# Altium footprint library con-samtec.PCBLIB: 805 footprints (part 20 of 55)
Each footprint in its own frame and in the unit in brackets; x right, y up, seen from the top. Pads: shape width x height; smd on the part's side, far side on the other; paste and mask are expansions set on the pad; w line width, h text height; cw(c..) or ccw(c..) is an arc to the next point about the centre after c.
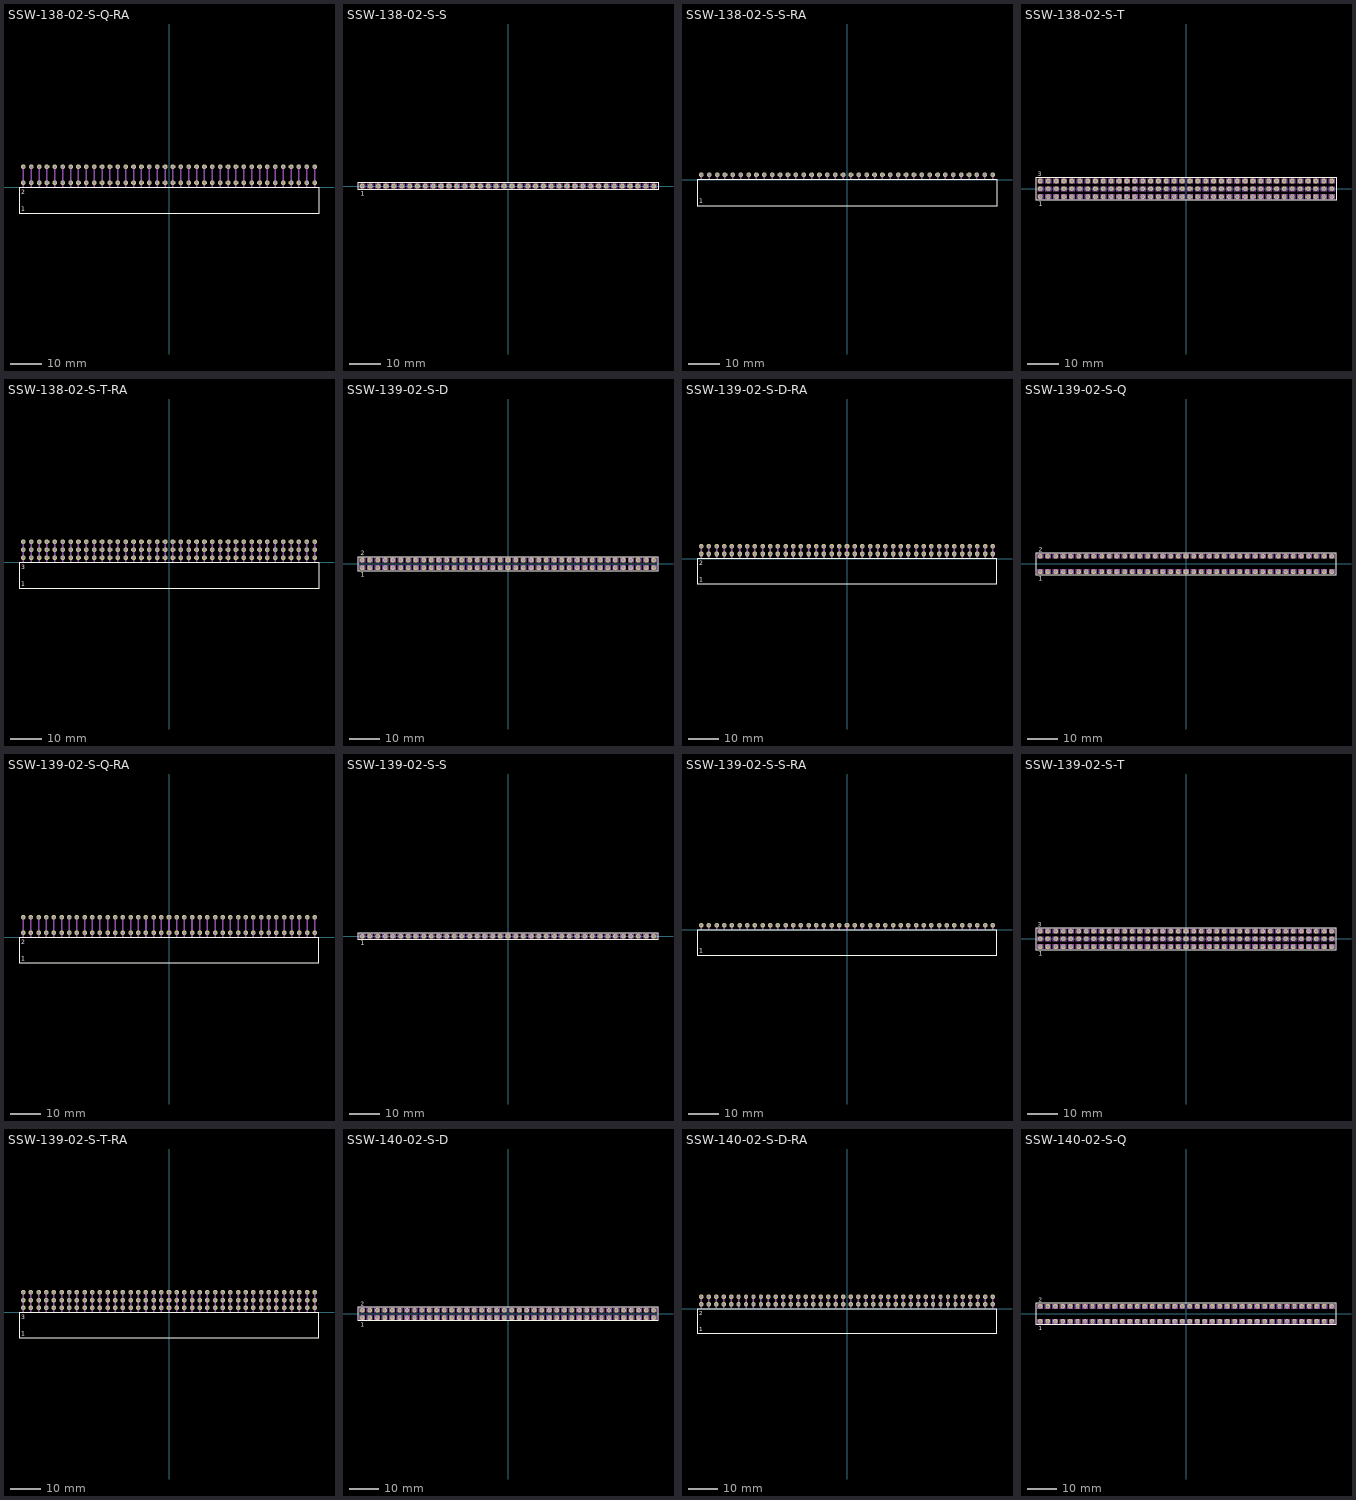
[diagram p19: the footprints below, top view; thin cyan lines are the x and y axes]

## SSW-138-02-S-Q-RA [mil]
pads (76):
  oct 59.06x59.06 hole 39.37: 1(-1850,60) 2(-1850,260) 3(-1750,60) 4(-1750,260) 5(-1650,60) 6(-1650,260) 7(-1550,60) 8(-1550,260) 9(-1450,60) 10(-1450,260) 11(-1350,60) 12(-1350,260) 13(-1250,60) 14(-1250,260) 15(-1150,60) 16(-1150,260) 17(-1050,60) 18(-1050,260) 19(-950,60) 20(-950,260) 21(-850,60) 22(-850,260) 23(-750,60) 24(-750,260) 25(-650,60) 26(-650,260) 27(-550,60) 28(-550,260) 29(-450,60) 30(-450,260) 31(-350,60) 32(-350,260) 33(-250,60) 34(-250,260) 35(-150,60) 36(-150,260) 37(-50,60) 38(-50,260) 39(50,60) 40(50,260) 41(150,60) 42(150,260) 43(250,60) 44(250,260) 45(350,60) 46(350,260) 47(450,60) 48(450,260) 49(550,60) 50(550,260) 51(650,60) 52(650,260) 53(750,60) 54(750,260) 55(850,60) 56(850,260) 57(950,60) 58(950,260) 59(1050,60) 60(1050,260) 61(1150,60) 62(1150,260) 63(1250,60) 64(1250,260) 65(1350,60) 66(1350,260) 67(1450,60) 68(1450,260) 69(1550,60) 70(1550,260) 71(1650,60) 72(1650,260) 73(1750,60) 74(1750,260) 75(1850,60) 76(1850,260)
Top Overlay:
  lines w8: -1905.08,-330.55 1905.08,-330.55 1905.08,-4.17 -1905.08,-4.17 -1905.08,-330.55
  text "1" at -1873.43,-301.18 h56.1
  text "2" at -1876.38,-86.61 h56.1
Mechanical 16:
  rectangle: -1860,0 -1840,270
  rectangle: -1760,0 -1740,270
  rectangle: -1660,0 -1640,270
  rectangle: -1560,0 -1540,270
  rectangle: -1460,0 -1440,270
  rectangle: -1360,0 -1340,270
  rectangle: -1260,0 -1240,270
  rectangle: -1160,0 -1140,270
  rectangle: -1060,0 -1040,270
  rectangle: -960,0 -940,270
  rectangle: -860,0 -840,270
  rectangle: -760,0 -740,270
  rectangle: -660,0 -640,270
  rectangle: -560,0 -540,270
  rectangle: -460,0 -440,270
  rectangle: -360,0 -340,270
  rectangle: -260,0 -240,270
  rectangle: -160,0 -140,270
  rectangle: -60,0 -40,270
  rectangle: 40,0 60,270
  rectangle: 140,0 160,270
  rectangle: 240,0 260,270
  rectangle: 340,0 360,270
  rectangle: 440,0 460,270
  rectangle: 540,0 560,270
  rectangle: 640,0 660,270
  rectangle: 740,0 760,270
  rectangle: 840,0 860,270
  rectangle: 940,0 960,270
  rectangle: 1040,0 1060,270
  rectangle: 1140,0 1160,270
  rectangle: 1240,0 1260,270
  rectangle: 1340,0 1360,270
  rectangle: 1440,0 1460,270
  rectangle: 1540,0 1560,270
  rectangle: 1640,0 1660,270
  rectangle: 1740,0 1760,270
  rectangle: 1840,0 1860,270

## SSW-138-02-S-S [mm]
pads (38):
  oct 1.5x1.5 hole 1: 1(-46.99,0) 2(-44.45,0) 3(-41.91,0) 4(-39.37,0) 5(-36.83,0) 6(-34.29,0) 7(-31.75,0) 8(-29.21,0) 9(-26.67,0) 10(-24.13,0) 11(-21.59,0) 12(-19.05,0) 13(-16.51,0) 14(-13.97,0) 15(-11.43,0) 16(-8.89,0) 17(-6.35,0) 18(-3.81,0) 19(-1.27,0) 20(1.27,0) 21(3.81,0) 22(6.35,0) 23(8.89,0) 24(11.43,0) 25(13.97,0) 26(16.51,0) 27(19.05,0) 28(21.59,0) 29(24.13,0) 30(26.67,0) 31(29.21,0) 32(31.75,0) 33(34.29,0) 34(36.83,0) 35(39.37,0) 36(41.91,0) 37(44.45,0) 38(46.99,0)
Top Overlay:
  lines w0.203: -48.389,-1.155 48.389,-1.155 48.389,1.155 -48.389,1.155 -48.389,-1.155
  text "1" at -47.498,-3.048 h1.42
Mechanical 16:
  drawing of 152 lines, arcs and shapes, not listed

## SSW-138-02-S-S-RA [mil]
pads (38):
  oct 59.06x59.06 hole 39.37: 1(-1850,60) 2(-1750,60) 3(-1650,60) 4(-1550,60) 5(-1450,60) 6(-1350,60) 7(-1250,60) 8(-1150,60) 9(-1050,60) 10(-950,60) 11(-850,60) 12(-750,60) 13(-650,60) 14(-550,60) 15(-450,60) 16(-350,60) 17(-250,60) 18(-150,60) 19(-50,60) 20(50,60) 21(150,60) 22(250,60) 23(350,60) 24(450,60) 25(550,60) 26(650,60) 27(750,60) 28(850,60) 29(950,60) 30(1050,60) 31(1150,60) 32(1250,60) 33(1350,60) 34(1450,60) 35(1550,60) 36(1650,60) 37(1750,60) 38(1850,60)
Top Overlay:
  lines w8: -1905.08,-330.55 1905.08,-330.55 1905.08,-4.17 -1905.08,-4.17 -1905.08,-330.55
  text "1" at -1873.43,-301.18 h56.1
Mechanical 16:
  rectangle: -1860,0 -1840,70
  rectangle: -1760,0 -1740,70
  rectangle: -1660,0 -1640,70
  rectangle: -1560,0 -1540,70
  rectangle: -1460,0 -1440,70
  rectangle: -1360,0 -1340,70
  rectangle: -1260,0 -1240,70
  rectangle: -1160,0 -1140,70
  rectangle: -1060,0 -1040,70
  rectangle: -960,0 -940,70
  rectangle: -860,0 -840,70
  rectangle: -760,0 -740,70
  rectangle: -660,0 -640,70
  rectangle: -560,0 -540,70
  rectangle: -460,0 -440,70
  rectangle: -360,0 -340,70
  rectangle: -260,0 -240,70
  rectangle: -160,0 -140,70
  rectangle: -60,0 -40,70
  rectangle: 40,0 60,70
  rectangle: 140,0 160,70
  rectangle: 240,0 260,70
  rectangle: 340,0 360,70
  rectangle: 440,0 460,70
  rectangle: 540,0 560,70
  rectangle: 640,0 660,70
  rectangle: 740,0 760,70
  rectangle: 840,0 860,70
  rectangle: 940,0 960,70
  rectangle: 1040,0 1060,70
  rectangle: 1140,0 1160,70
  rectangle: 1240,0 1260,70
  rectangle: 1340,0 1360,70
  rectangle: 1440,0 1460,70
  rectangle: 1540,0 1560,70
  rectangle: 1640,0 1660,70
  rectangle: 1740,0 1760,70
  rectangle: 1840,0 1860,70

## SSW-138-02-S-T [mm]
pads (114):
  oct 1.5x1.5 hole 1: 1(-46.99,-2.54) 2(-46.99,0) 3(-46.99,2.54) 4(-44.45,-2.54) 5(-44.45,0) 6(-44.45,2.54) 7(-41.91,-2.54) 8(-41.91,0) 9(-41.91,2.54) 10(-39.37,-2.54) 11(-39.37,0) 12(-39.37,2.54) 13(-36.83,-2.54) 14(-36.83,0) 15(-36.83,2.54) 16(-34.29,-2.54) 17(-34.29,0) 18(-34.29,2.54) 19(-31.75,-2.54) 20(-31.75,0) 21(-31.75,2.54) 22(-29.21,-2.54) 23(-29.21,0) 24(-29.21,2.54) 25(-26.67,-2.54) 26(-26.67,0) 27(-26.67,2.54) 28(-24.13,-2.54) 29(-24.13,0) 30(-24.13,2.54) 31(-21.59,-2.54) 32(-21.59,0) 33(-21.59,2.54) 34(-19.05,-2.54) 35(-19.05,0) 36(-19.05,2.54) 37(-16.51,-2.54) 38(-16.51,0) 39(-16.51,2.54) 40(-13.97,-2.54) 41(-13.97,0) 42(-13.97,2.54) 43(-11.43,-2.54) 44(-11.43,0) 45(-11.43,2.54) 46(-8.89,-2.54) 47(-8.89,0) 48(-8.89,2.54) 49(-6.35,-2.54) 50(-6.35,0) 51(-6.35,2.54) 52(-3.81,-2.54) 53(-3.81,0) 54(-3.81,2.54) 55(-1.27,-2.54) 56(-1.27,0) 57(-1.27,2.54) 58(1.27,-2.54) 59(1.27,0) 60(1.27,2.54) 61(3.81,-2.54) 62(3.81,0) 63(3.81,2.54) 64(6.35,-2.54) 65(6.35,0) 66(6.35,2.54) 67(8.89,-2.54) 68(8.89,0) 69(8.89,2.54) 70(11.43,-2.54) 71(11.43,0) 72(11.43,2.54) 73(13.97,-2.54) 74(13.97,0) 75(13.97,2.54) 76(16.51,-2.54) 77(16.51,0) 78(16.51,2.54) 79(19.05,-2.54) 80(19.05,0) 81(19.05,2.54) 82(21.59,-2.54) 83(21.59,0) 84(21.59,2.54) 85(24.13,-2.54) 86(24.13,0) 87(24.13,2.54) 88(26.67,-2.54) 89(26.67,0) 90(26.67,2.54) 91(29.21,-2.54) 92(29.21,0) 93(29.21,2.54) 94(31.75,-2.54) 95(31.75,0) 96(31.75,2.54) 97(34.29,-2.54) 98(34.29,0) 99(34.29,2.54) 100(36.83,-2.54) 101(36.83,0) 102(36.83,2.54) 103(39.37,-2.54) 104(39.37,0) 105(39.37,2.54) 106(41.91,-2.54) 107(41.91,0) 108(41.91,2.54) 109(44.45,-2.54) 110(44.45,0) 111(44.45,2.54) 112(46.99,-2.54) 113(46.99,0) 114(46.99,2.54)
Top Overlay:
  lines w0.203: -48.389,-3.695 48.389,-3.695 48.389,3.695 -48.389,3.695 -48.389,-3.695
  text "1" at -47.498,-5.588 h1.42
  text "3" at -47.752,4.064 h1.42
Mechanical 16:
  drawing of 456 lines, arcs and shapes, not listed

## SSW-138-02-S-T-RA [mil]
pads (114):
  oct 59.06x59.06 hole 39.37: 1(-1850,60) 2(-1850,160) 3(-1850,260) 4(-1750,60) 5(-1750,160) 6(-1750,260) 7(-1650,60) 8(-1650,160) 9(-1650,260) 10(-1550,60) 11(-1550,160) 12(-1550,260) 13(-1450,60) 14(-1450,160) 15(-1450,260) 16(-1350,60) 17(-1350,160) 18(-1350,260) 19(-1250,60) 20(-1250,160) 21(-1250,260) 22(-1150,60) 23(-1150,160) 24(-1150,260) 25(-1050,60) 26(-1050,160) 27(-1050,260) 28(-950,60) 29(-950,160) 30(-950,260) 31(-850,60) 32(-850,160) 33(-850,260) 34(-750,60) 35(-750,160) 36(-750,260) 37(-650,60) 38(-650,160) 39(-650,260) 40(-550,60) 41(-550,160) 42(-550,260) 43(-450,60) 44(-450,160) 45(-450,260) 46(-350,60) 47(-350,160) 48(-350,260) 49(-250,60) 50(-250,160) 51(-250,260) 52(-150,60) 53(-150,160) 54(-150,260) 55(-50,60) 56(-50,160) 57(-50,260) 58(50,60) 59(50,160) 60(50,260) 61(150,60) 62(150,160) 63(150,260) 64(250,60) 65(250,160) 66(250,260) 67(350,60) 68(350,160) 69(350,260) 70(450,60) 71(450,160) 72(450,260) 73(550,60) 74(550,160) 75(550,260) 76(650,60) 77(650,160) 78(650,260) 79(750,60) 80(750,160) 81(750,260) 82(850,60) 83(850,160) 84(850,260) 85(950,60) 86(950,160) 87(950,260) 88(1050,60) 89(1050,160) 90(1050,260) 91(1150,60) 92(1150,160) 93(1150,260) 94(1250,60) 95(1250,160) 96(1250,260) 97(1350,60) 98(1350,160) 99(1350,260) 100(1450,60) 101(1450,160) 102(1450,260) 103(1550,60) 104(1550,160) 105(1550,260) 106(1650,60) 107(1650,160) 108(1650,260) 109(1750,60) 110(1750,160) 111(1750,260) 112(1850,60) 113(1850,160) 114(1850,260)
Top Overlay:
  lines w8: -1905.08,-330.55 1905.08,-330.55 1905.08,-4.17 -1905.08,-4.17 -1905.08,-330.55
  text "1" at -1873.43,-301.18 h56.1
  text "3" at -1876.38,-86.61 h56.1
Mechanical 16:
  rectangle: -1860,0 -1840,270
  rectangle: -1760,0 -1740,270
  rectangle: -1660,0 -1640,270
  rectangle: -1560,0 -1540,270
  rectangle: -1460,0 -1440,270
  rectangle: -1360,0 -1340,270
  rectangle: -1260,0 -1240,270
  rectangle: -1160,0 -1140,270
  rectangle: -1060,0 -1040,270
  rectangle: -960,0 -940,270
  rectangle: -860,0 -840,270
  rectangle: -760,0 -740,270
  rectangle: -660,0 -640,270
  rectangle: -560,0 -540,270
  rectangle: -460,0 -440,270
  rectangle: -360,0 -340,270
  rectangle: -260,0 -240,270
  rectangle: -160,0 -140,270
  rectangle: -60,0 -40,270
  rectangle: 40,0 60,270
  rectangle: 140,0 160,270
  rectangle: 240,0 260,270
  rectangle: 340,0 360,270
  rectangle: 440,0 460,270
  rectangle: 540,0 560,270
  rectangle: 640,0 660,270
  rectangle: 740,0 760,270
  rectangle: 840,0 860,270
  rectangle: 940,0 960,270
  rectangle: 1040,0 1060,270
  rectangle: 1140,0 1160,270
  rectangle: 1240,0 1260,270
  rectangle: 1340,0 1360,270
  rectangle: 1440,0 1460,270
  rectangle: 1540,0 1560,270
  rectangle: 1640,0 1660,270
  rectangle: 1740,0 1760,270
  rectangle: 1840,0 1860,270

## SSW-139-02-S-D [mm]
pads (78):
  oct 1.5x1.5 hole 1: 1(-48.26,-1.27) 2(-48.26,1.27) 3(-45.72,-1.27) 4(-45.72,1.27) 5(-43.18,-1.27) 6(-43.18,1.27) 7(-40.64,-1.27) 8(-40.64,1.27) 9(-38.1,-1.27) 10(-38.1,1.27) 11(-35.56,-1.27) 12(-35.56,1.27) 13(-33.02,-1.27) 14(-33.02,1.27) 15(-30.48,-1.27) 16(-30.48,1.27) 17(-27.94,-1.27) 18(-27.94,1.27) 19(-25.4,-1.27) 20(-25.4,1.27) 21(-22.86,-1.27) 22(-22.86,1.27) 23(-20.32,-1.27) 24(-20.32,1.27) 25(-17.78,-1.27) 26(-17.78,1.27) 27(-15.24,-1.27) 28(-15.24,1.27) 29(-12.7,-1.27) 30(-12.7,1.27) 31(-10.16,-1.27) 32(-10.16,1.27) 33(-7.62,-1.27) 34(-7.62,1.27) 35(-5.08,-1.27) 36(-5.08,1.27) 37(-2.54,-1.27) 38(-2.54,1.27) 39(0,-1.27) 40(0,1.27) 41(2.54,-1.27) 42(2.54,1.27) 43(5.08,-1.27) 44(5.08,1.27) 45(7.62,-1.27) 46(7.62,1.27) 47(10.16,-1.27) 48(10.16,1.27) 49(12.7,-1.27) 50(12.7,1.27) 51(15.24,-1.27) 52(15.24,1.27) 53(17.78,-1.27) 54(17.78,1.27) 55(20.32,-1.27) 56(20.32,1.27) 57(22.86,-1.27) 58(22.86,1.27) 59(25.4,-1.27) 60(25.4,1.27) 61(27.94,-1.27) 62(27.94,1.27) 63(30.48,-1.27) 64(30.48,1.27) 65(33.02,-1.27) 66(33.02,1.27) 67(35.56,-1.27) 68(35.56,1.27) 69(38.1,-1.27) 70(38.1,1.27) 71(40.64,-1.27) 72(40.64,1.27) 73(43.18,-1.27) 74(43.18,1.27) 75(45.72,-1.27) 76(45.72,1.27) 77(48.26,-1.27) 78(48.26,1.27)
Top Overlay:
  lines w0.203: -49.659,-2.425 49.659,-2.425 49.659,2.425 -49.659,2.425 -49.659,-2.425
  text "1" at -48.768,-4.318 h1.42
  text "2" at -48.768,2.794 h1.42
Mechanical 16:
  drawing of 312 lines, arcs and shapes, not listed

## SSW-139-02-S-D-RA [mil]
pads (78):
  oct 59.06x59.06 hole 39.37: 1(-1900,60) 2(-1900,160) 3(-1800,60) 4(-1800,160) 5(-1700,60) 6(-1700,160) 7(-1600,60) 8(-1600,160) 9(-1500,60) 10(-1500,160) 11(-1400,60) 12(-1400,160) 13(-1300,60) 14(-1300,160) 15(-1200,60) 16(-1200,160) 17(-1100,60) 18(-1100,160) 19(-1000,60) 20(-1000,160) 21(-900,60) 22(-900,160) 23(-800,60) 24(-800,160) 25(-700,60) 26(-700,160) 27(-600,60) 28(-600,160) 29(-500,60) 30(-500,160) 31(-400,60) 32(-400,160) 33(-300,60) 34(-300,160) 35(-200,60) 36(-200,160) 37(-100,60) 38(-100,160) 39(0,60) 40(0,160) 41(100,60) 42(100,160) 43(200,60) 44(200,160) 45(300,60) 46(300,160) 47(400,60) 48(400,160) 49(500,60) 50(500,160) 51(600,60) 52(600,160) 53(700,60) 54(700,160) 55(800,60) 56(800,160) 57(900,60) 58(900,160) 59(1000,60) 60(1000,160) 61(1100,60) 62(1100,160) 63(1200,60) 64(1200,160) 65(1300,60) 66(1300,160) 67(1400,60) 68(1400,160) 69(1500,60) 70(1500,160) 71(1600,60) 72(1600,160) 73(1700,60) 74(1700,160) 75(1800,60) 76(1800,160) 77(1900,60) 78(1900,160)
Top Overlay:
  lines w8: -1955.08,-330.55 1955.08,-330.55 1955.08,-4.17 -1955.08,-4.17 -1955.08,-330.55
  text "1" at -1923.43,-301.18 h56.1
  text "2" at -1926.38,-86.61 h56.1
Mechanical 16:
  rectangle: -1910,0 -1890,170
  rectangle: -1810,0 -1790,170
  rectangle: -1710,0 -1690,170
  rectangle: -1610,0 -1590,170
  rectangle: -1510,0 -1490,170
  rectangle: -1410,0 -1390,170
  rectangle: -1310,0 -1290,170
  rectangle: -1210,0 -1190,170
  rectangle: -1110,0 -1090,170
  rectangle: -1010,0 -990,170
  rectangle: -910,0 -890,170
  rectangle: -810,0 -790,170
  rectangle: -710,0 -690,170
  rectangle: -610,0 -590,170
  rectangle: -510,0 -490,170
  rectangle: -410,0 -390,170
  rectangle: -310,0 -290,170
  rectangle: -210,0 -190,170
  rectangle: -110,0 -90,170
  rectangle: -10,0 10,170
  rectangle: 90,0 110,170
  rectangle: 190,0 210,170
  rectangle: 290,0 310,170
  rectangle: 390,0 410,170
  rectangle: 490,0 510,170
  rectangle: 590,0 610,170
  rectangle: 690,0 710,170
  rectangle: 790,0 810,170
  rectangle: 890,0 910,170
  rectangle: 990,0 1010,170
  rectangle: 1090,0 1110,170
  rectangle: 1190,0 1210,170
  rectangle: 1290,0 1310,170
  rectangle: 1390,0 1410,170
  rectangle: 1490,0 1510,170
  rectangle: 1590,0 1610,170
  rectangle: 1690,0 1710,170
  rectangle: 1790,0 1810,170
  rectangle: 1890,0 1910,170

## SSW-139-02-S-Q [mm]
pads (78):
  oct 1.5x1.5 hole 1: 1(-48.26,-2.54) 2(-48.26,2.54) 3(-45.72,-2.54) 4(-45.72,2.54) 5(-43.18,-2.54) 6(-43.18,2.54) 7(-40.64,-2.54) 8(-40.64,2.54) 9(-38.1,-2.54) 10(-38.1,2.54) 11(-35.56,-2.54) 12(-35.56,2.54) 13(-33.02,-2.54) 14(-33.02,2.54) 15(-30.48,-2.54) 16(-30.48,2.54) 17(-27.94,-2.54) 18(-27.94,2.54) 19(-25.4,-2.54) 20(-25.4,2.54) 21(-22.86,-2.54) 22(-22.86,2.54) 23(-20.32,-2.54) 24(-20.32,2.54) 25(-17.78,-2.54) 26(-17.78,2.54) 27(-15.24,-2.54) 28(-15.24,2.54) 29(-12.7,-2.54) 30(-12.7,2.54) 31(-10.16,-2.54) 32(-10.16,2.54) 33(-7.62,-2.54) 34(-7.62,2.54) 35(-5.08,-2.54) 36(-5.08,2.54) 37(-2.54,-2.54) 38(-2.54,2.54) 39(0,-2.54) 40(0,2.54) 41(2.54,-2.54) 42(2.54,2.54) 43(5.08,-2.54) 44(5.08,2.54) 45(7.62,-2.54) 46(7.62,2.54) 47(10.16,-2.54) 48(10.16,2.54) 49(12.7,-2.54) 50(12.7,2.54) 51(15.24,-2.54) 52(15.24,2.54) 53(17.78,-2.54) 54(17.78,2.54) 55(20.32,-2.54) 56(20.32,2.54) 57(22.86,-2.54) 58(22.86,2.54) 59(25.4,-2.54) 60(25.4,2.54) 61(27.94,-2.54) 62(27.94,2.54) 63(30.48,-2.54) 64(30.48,2.54) 65(33.02,-2.54) 66(33.02,2.54) 67(35.56,-2.54) 68(35.56,2.54) 69(38.1,-2.54) 70(38.1,2.54) 71(40.64,-2.54) 72(40.64,2.54) 73(43.18,-2.54) 74(43.18,2.54) 75(45.72,-2.54) 76(45.72,2.54) 77(48.26,-2.54) 78(48.26,2.54)
Top Overlay:
  lines w0.203: -49.659,-3.695 49.659,-3.695 49.659,3.695 -49.659,3.695 -49.659,-3.695
  text "1" at -48.768,-5.588 h1.42
  text "2" at -48.768,4.064 h1.42
Mechanical 16:
  drawing of 312 lines, arcs and shapes, not listed

## SSW-139-02-S-Q-RA [mil]
pads (78):
  oct 59.06x59.06 hole 39.37: 1(-1900,60) 2(-1900,260) 3(-1800,60) 4(-1800,260) 5(-1700,60) 6(-1700,260) 7(-1600,60) 8(-1600,260) 9(-1500,60) 10(-1500,260) 11(-1400,60) 12(-1400,260) 13(-1300,60) 14(-1300,260) 15(-1200,60) 16(-1200,260) 17(-1100,60) 18(-1100,260) 19(-1000,60) 20(-1000,260) 21(-900,60) 22(-900,260) 23(-800,60) 24(-800,260) 25(-700,60) 26(-700,260) 27(-600,60) 28(-600,260) 29(-500,60) 30(-500,260) 31(-400,60) 32(-400,260) 33(-300,60) 34(-300,260) 35(-200,60) 36(-200,260) 37(-100,60) 38(-100,260) 39(0,60) 40(0,260) 41(100,60) 42(100,260) 43(200,60) 44(200,260) 45(300,60) 46(300,260) 47(400,60) 48(400,260) 49(500,60) 50(500,260) 51(600,60) 52(600,260) 53(700,60) 54(700,260) 55(800,60) 56(800,260) 57(900,60) 58(900,260) 59(1000,60) 60(1000,260) 61(1100,60) 62(1100,260) 63(1200,60) 64(1200,260) 65(1300,60) 66(1300,260) 67(1400,60) 68(1400,260) 69(1500,60) 70(1500,260) 71(1600,60) 72(1600,260) 73(1700,60) 74(1700,260) 75(1800,60) 76(1800,260) 77(1900,60) 78(1900,260)
Top Overlay:
  lines w8: -1955.08,-330.55 1955.08,-330.55 1955.08,-4.17 -1955.08,-4.17 -1955.08,-330.55
  text "1" at -1923.43,-301.18 h56.1
  text "2" at -1926.38,-86.61 h56.1
Mechanical 16:
  rectangle: -1910,0 -1890,270
  rectangle: -1810,0 -1790,270
  rectangle: -1710,0 -1690,270
  rectangle: -1610,0 -1590,270
  rectangle: -1510,0 -1490,270
  rectangle: -1410,0 -1390,270
  rectangle: -1310,0 -1290,270
  rectangle: -1210,0 -1190,270
  rectangle: -1110,0 -1090,270
  rectangle: -1010,0 -990,270
  rectangle: -910,0 -890,270
  rectangle: -810,0 -790,270
  rectangle: -710,0 -690,270
  rectangle: -610,0 -590,270
  rectangle: -510,0 -490,270
  rectangle: -410,0 -390,270
  rectangle: -310,0 -290,270
  rectangle: -210,0 -190,270
  rectangle: -110,0 -90,270
  rectangle: -10,0 10,270
  rectangle: 90,0 110,270
  rectangle: 190,0 210,270
  rectangle: 290,0 310,270
  rectangle: 390,0 410,270
  rectangle: 490,0 510,270
  rectangle: 590,0 610,270
  rectangle: 690,0 710,270
  rectangle: 790,0 810,270
  rectangle: 890,0 910,270
  rectangle: 990,0 1010,270
  rectangle: 1090,0 1110,270
  rectangle: 1190,0 1210,270
  rectangle: 1290,0 1310,270
  rectangle: 1390,0 1410,270
  rectangle: 1490,0 1510,270
  rectangle: 1590,0 1610,270
  rectangle: 1690,0 1710,270
  rectangle: 1790,0 1810,270
  rectangle: 1890,0 1910,270

## SSW-139-02-S-S [mm]
pads (39):
  oct 1.5x1.5 hole 1: 1(-48.26,0) 2(-45.72,0) 3(-43.18,0) 4(-40.64,0) 5(-38.1,0) 6(-35.56,0) 7(-33.02,0) 8(-30.48,0) 9(-27.94,0) 10(-25.4,0) 11(-22.86,0) 12(-20.32,0) 13(-17.78,0) 14(-15.24,0) 15(-12.7,0) 16(-10.16,0) 17(-7.62,0) 18(-5.08,0) 19(-2.54,0) 20(0,0) 21(2.54,0) 22(5.08,0) 23(7.62,0) 24(10.16,0) 25(12.7,0) 26(15.24,0) 27(17.78,0) 28(20.32,0) 29(22.86,0) 30(25.4,0) 31(27.94,0) 32(30.48,0) 33(33.02,0) 34(35.56,0) 35(38.1,0) 36(40.64,0) 37(43.18,0) 38(45.72,0) 39(48.26,0)
Top Overlay:
  lines w0.203: -49.659,-1.155 49.659,-1.155 49.659,1.155 -49.659,1.155 -49.659,-1.155
  text "1" at -48.768,-3.048 h1.42
Mechanical 16:
  drawing of 156 lines, arcs and shapes, not listed

## SSW-139-02-S-S-RA [mil]
pads (39):
  oct 59.06x59.06 hole 39.37: 1(-1900,60) 2(-1800,60) 3(-1700,60) 4(-1600,60) 5(-1500,60) 6(-1400,60) 7(-1300,60) 8(-1200,60) 9(-1100,60) 10(-1000,60) 11(-900,60) 12(-800,60) 13(-700,60) 14(-600,60) 15(-500,60) 16(-400,60) 17(-300,60) 18(-200,60) 19(-100,60) 20(0,60) 21(100,60) 22(200,60) 23(300,60) 24(400,60) 25(500,60) 26(600,60) 27(700,60) 28(800,60) 29(900,60) 30(1000,60) 31(1100,60) 32(1200,60) 33(1300,60) 34(1400,60) 35(1500,60) 36(1600,60) 37(1700,60) 38(1800,60) 39(1900,60)
Top Overlay:
  lines w8: -1955.08,-330.55 1955.08,-330.55 1955.08,-4.17 -1955.08,-4.17 -1955.08,-330.55
  text "1" at -1923.43,-301.18 h56.1
Mechanical 16:
  rectangle: -1910,0 -1890,70
  rectangle: -1810,0 -1790,70
  rectangle: -1710,0 -1690,70
  rectangle: -1610,0 -1590,70
  rectangle: -1510,0 -1490,70
  rectangle: -1410,0 -1390,70
  rectangle: -1310,0 -1290,70
  rectangle: -1210,0 -1190,70
  rectangle: -1110,0 -1090,70
  rectangle: -1010,0 -990,70
  rectangle: -910,0 -890,70
  rectangle: -810,0 -790,70
  rectangle: -710,0 -690,70
  rectangle: -610,0 -590,70
  rectangle: -510,0 -490,70
  rectangle: -410,0 -390,70
  rectangle: -310,0 -290,70
  rectangle: -210,0 -190,70
  rectangle: -110,0 -90,70
  rectangle: -10,0 10,70
  rectangle: 90,0 110,70
  rectangle: 190,0 210,70
  rectangle: 290,0 310,70
  rectangle: 390,0 410,70
  rectangle: 490,0 510,70
  rectangle: 590,0 610,70
  rectangle: 690,0 710,70
  rectangle: 790,0 810,70
  rectangle: 890,0 910,70
  rectangle: 990,0 1010,70
  rectangle: 1090,0 1110,70
  rectangle: 1190,0 1210,70
  rectangle: 1290,0 1310,70
  rectangle: 1390,0 1410,70
  rectangle: 1490,0 1510,70
  rectangle: 1590,0 1610,70
  rectangle: 1690,0 1710,70
  rectangle: 1790,0 1810,70
  rectangle: 1890,0 1910,70

## SSW-139-02-S-T [mm]
pads (117):
  oct 1.5x1.5 hole 1: 1(-48.26,-2.54) 2(-48.26,0) 3(-48.26,2.54) 4(-45.72,-2.54) 5(-45.72,0) 6(-45.72,2.54) 7(-43.18,-2.54) 8(-43.18,0) 9(-43.18,2.54) 10(-40.64,-2.54) 11(-40.64,0) 12(-40.64,2.54) 13(-38.1,-2.54) 14(-38.1,0) 15(-38.1,2.54) 16(-35.56,-2.54) 17(-35.56,0) 18(-35.56,2.54) 19(-33.02,-2.54) 20(-33.02,0) 21(-33.02,2.54) 22(-30.48,-2.54) 23(-30.48,0) 24(-30.48,2.54) 25(-27.94,-2.54) 26(-27.94,0) 27(-27.94,2.54) 28(-25.4,-2.54) 29(-25.4,0) 30(-25.4,2.54) 31(-22.86,-2.54) 32(-22.86,0) 33(-22.86,2.54) 34(-20.32,-2.54) 35(-20.32,0) 36(-20.32,2.54) 37(-17.78,-2.54) 38(-17.78,0) 39(-17.78,2.54) 40(-15.24,-2.54) 41(-15.24,0) 42(-15.24,2.54) 43(-12.7,-2.54) 44(-12.7,0) 45(-12.7,2.54) 46(-10.16,-2.54) 47(-10.16,0) 48(-10.16,2.54) 49(-7.62,-2.54) 50(-7.62,0) 51(-7.62,2.54) 52(-5.08,-2.54) 53(-5.08,0) 54(-5.08,2.54) 55(-2.54,-2.54) 56(-2.54,0) 57(-2.54,2.54) 58(0,-2.54) 59(0,0) 60(0,2.54) 61(2.54,-2.54) 62(2.54,0) 63(2.54,2.54) 64(5.08,-2.54) 65(5.08,0) 66(5.08,2.54) 67(7.62,-2.54) 68(7.62,0) 69(7.62,2.54) 70(10.16,-2.54) 71(10.16,0) 72(10.16,2.54) 73(12.7,-2.54) 74(12.7,0) 75(12.7,2.54) 76(15.24,-2.54) 77(15.24,0) 78(15.24,2.54) 79(17.78,-2.54) 80(17.78,0) 81(17.78,2.54) 82(20.32,-2.54) 83(20.32,0) 84(20.32,2.54) 85(22.86,-2.54) 86(22.86,0) 87(22.86,2.54) 88(25.4,-2.54) 89(25.4,0) 90(25.4,2.54) 91(27.94,-2.54) 92(27.94,0) 93(27.94,2.54) 94(30.48,-2.54) 95(30.48,0) 96(30.48,2.54) 97(33.02,-2.54) 98(33.02,0) 99(33.02,2.54) 100(35.56,-2.54) 101(35.56,0) 102(35.56,2.54) 103(38.1,-2.54) 104(38.1,0) 105(38.1,2.54) 106(40.64,-2.54) 107(40.64,0) 108(40.64,2.54) 109(43.18,-2.54) 110(43.18,0) 111(43.18,2.54) 112(45.72,-2.54) 113(45.72,0) 114(45.72,2.54) 115(48.26,-2.54) 116(48.26,0) 117(48.26,2.54)
Top Overlay:
  lines w0.203: -49.659,-3.695 49.659,-3.695 49.659,3.695 -49.659,3.695 -49.659,-3.695
  text "1" at -48.768,-5.588 h1.42
  text "3" at -49.022,4.064 h1.42
Mechanical 16:
  drawing of 468 lines, arcs and shapes, not listed

## SSW-139-02-S-T-RA [mil]
pads (117):
  oct 59.06x59.06 hole 39.37: 1(-1900,60) 2(-1900,160) 3(-1900,260) 4(-1800,60) 5(-1800,160) 6(-1800,260) 7(-1700,60) 8(-1700,160) 9(-1700,260) 10(-1600,60) 11(-1600,160) 12(-1600,260) 13(-1500,60) 14(-1500,160) 15(-1500,260) 16(-1400,60) 17(-1400,160) 18(-1400,260) 19(-1300,60) 20(-1300,160) 21(-1300,260) 22(-1200,60) 23(-1200,160) 24(-1200,260) 25(-1100,60) 26(-1100,160) 27(-1100,260) 28(-1000,60) 29(-1000,160) 30(-1000,260) 31(-900,60) 32(-900,160) 33(-900,260) 34(-800,60) 35(-800,160) 36(-800,260) 37(-700,60) 38(-700,160) 39(-700,260) 40(-600,60) 41(-600,160) 42(-600,260) 43(-500,60) 44(-500,160) 45(-500,260) 46(-400,60) 47(-400,160) 48(-400,260) 49(-300,60) 50(-300,160) 51(-300,260) 52(-200,60) 53(-200,160) 54(-200,260) 55(-100,60) 56(-100,160) 57(-100,260) 58(0,60) 59(0,160) 60(0,260) 61(100,60) 62(100,160) 63(100,260) 64(200,60) 65(200,160) 66(200,260) 67(300,60) 68(300,160) 69(300,260) 70(400,60) 71(400,160) 72(400,260) 73(500,60) 74(500,160) 75(500,260) 76(600,60) 77(600,160) 78(600,260) 79(700,60) 80(700,160) 81(700,260) 82(800,60) 83(800,160) 84(800,260) 85(900,60) 86(900,160) 87(900,260) 88(1000,60) 89(1000,160) 90(1000,260) 91(1100,60) 92(1100,160) 93(1100,260) 94(1200,60) 95(1200,160) 96(1200,260) 97(1300,60) 98(1300,160) 99(1300,260) 100(1400,60) 101(1400,160) 102(1400,260) 103(1500,60) 104(1500,160) 105(1500,260) 106(1600,60) 107(1600,160) 108(1600,260) 109(1700,60) 110(1700,160) 111(1700,260) 112(1800,60) 113(1800,160) 114(1800,260) 115(1900,60) 116(1900,160) 117(1900,260)
Top Overlay:
  lines w8: -1955.08,-330.55 1955.08,-330.55 1955.08,-4.17 -1955.08,-4.17 -1955.08,-330.55
  text "1" at -1923.43,-301.18 h56.1
  text "3" at -1926.38,-86.61 h56.1
Mechanical 16:
  rectangle: -1910,0 -1890,270
  rectangle: -1810,0 -1790,270
  rectangle: -1710,0 -1690,270
  rectangle: -1610,0 -1590,270
  rectangle: -1510,0 -1490,270
  rectangle: -1410,0 -1390,270
  rectangle: -1310,0 -1290,270
  rectangle: -1210,0 -1190,270
  rectangle: -1110,0 -1090,270
  rectangle: -1010,0 -990,270
  rectangle: -910,0 -890,270
  rectangle: -810,0 -790,270
  rectangle: -710,0 -690,270
  rectangle: -610,0 -590,270
  rectangle: -510,0 -490,270
  rectangle: -410,0 -390,270
  rectangle: -310,0 -290,270
  rectangle: -210,0 -190,270
  rectangle: -110,0 -90,270
  rectangle: -10,0 10,270
  rectangle: 90,0 110,270
  rectangle: 190,0 210,270
  rectangle: 290,0 310,270
  rectangle: 390,0 410,270
  rectangle: 490,0 510,270
  rectangle: 590,0 610,270
  rectangle: 690,0 710,270
  rectangle: 790,0 810,270
  rectangle: 890,0 910,270
  rectangle: 990,0 1010,270
  rectangle: 1090,0 1110,270
  rectangle: 1190,0 1210,270
  rectangle: 1290,0 1310,270
  rectangle: 1390,0 1410,270
  rectangle: 1490,0 1510,270
  rectangle: 1590,0 1610,270
  rectangle: 1690,0 1710,270
  rectangle: 1790,0 1810,270
  rectangle: 1890,0 1910,270

## SSW-140-02-S-D [mm]
pads (80):
  oct 1.5x1.5 hole 1: 1(-49.53,-1.27) 2(-49.53,1.27) 3(-46.99,-1.27) 4(-46.99,1.27) 5(-44.45,-1.27) 6(-44.45,1.27) 7(-41.91,-1.27) 8(-41.91,1.27) 9(-39.37,-1.27) 10(-39.37,1.27) 11(-36.83,-1.27) 12(-36.83,1.27) 13(-34.29,-1.27) 14(-34.29,1.27) 15(-31.75,-1.27) 16(-31.75,1.27) 17(-29.21,-1.27) 18(-29.21,1.27) 19(-26.67,-1.27) 20(-26.67,1.27) 21(-24.13,-1.27) 22(-24.13,1.27) 23(-21.59,-1.27) 24(-21.59,1.27) 25(-19.05,-1.27) 26(-19.05,1.27) 27(-16.51,-1.27) 28(-16.51,1.27) 29(-13.97,-1.27) 30(-13.97,1.27) 31(-11.43,-1.27) 32(-11.43,1.27) 33(-8.89,-1.27) 34(-8.89,1.27) 35(-6.35,-1.27) 36(-6.35,1.27) 37(-3.81,-1.27) 38(-3.81,1.27) 39(-1.27,-1.27) 40(-1.27,1.27) 41(1.27,-1.27) 42(1.27,1.27) 43(3.81,-1.27) 44(3.81,1.27) 45(6.35,-1.27) 46(6.35,1.27) 47(8.89,-1.27) 48(8.89,1.27) 49(11.43,-1.27) 50(11.43,1.27) 51(13.97,-1.27) 52(13.97,1.27) 53(16.51,-1.27) 54(16.51,1.27) 55(19.05,-1.27) 56(19.05,1.27) 57(21.59,-1.27) 58(21.59,1.27) 59(24.13,-1.27) 60(24.13,1.27) 61(26.67,-1.27) 62(26.67,1.27) 63(29.21,-1.27) 64(29.21,1.27) 65(31.75,-1.27) 66(31.75,1.27) 67(34.29,-1.27) 68(34.29,1.27) 69(36.83,-1.27) 70(36.83,1.27) 71(39.37,-1.27) 72(39.37,1.27) 73(41.91,-1.27) 74(41.91,1.27) 75(44.45,-1.27) 76(44.45,1.27) 77(46.99,-1.27) 78(46.99,1.27) 79(49.53,-1.27) 80(49.53,1.27)
Top Overlay:
  lines w0.203: -50.929,-2.425 50.929,-2.425 50.929,2.425 -50.929,2.425 -50.929,-2.425
  text "1" at -50.038,-4.318 h1.42
  text "2" at -50.038,2.794 h1.42
Mechanical 16:
  drawing of 320 lines, arcs and shapes, not listed

## SSW-140-02-S-D-RA [mil]
pads (80):
  oct 59.06x59.06 hole 39.37: 1(-1950,60) 2(-1950,160) 3(-1850,60) 4(-1850,160) 5(-1750,60) 6(-1750,160) 7(-1650,60) 8(-1650,160) 9(-1550,60) 10(-1550,160) 11(-1450,60) 12(-1450,160) 13(-1350,60) 14(-1350,160) 15(-1250,60) 16(-1250,160) 17(-1150,60) 18(-1150,160) 19(-1050,60) 20(-1050,160) 21(-950,60) 22(-950,160) 23(-850,60) 24(-850,160) 25(-750,60) 26(-750,160) 27(-650,60) 28(-650,160) 29(-550,60) 30(-550,160) 31(-450,60) 32(-450,160) 33(-350,60) 34(-350,160) 35(-250,60) 36(-250,160) 37(-150,60) 38(-150,160) 39(-50,60) 40(-50,160) 41(50,60) 42(50,160) 43(150,60) 44(150,160) 45(250,60) 46(250,160) 47(350,60) 48(350,160) 49(450,60) 50(450,160) 51(550,60) 52(550,160) 53(650,60) 54(650,160) 55(750,60) 56(750,160) 57(850,60) 58(850,160) 59(950,60) 60(950,160) 61(1050,60) 62(1050,160) 63(1150,60) 64(1150,160) 65(1250,60) 66(1250,160) 67(1350,60) 68(1350,160) 69(1450,60) 70(1450,160) 71(1550,60) 72(1550,160) 73(1650,60) 74(1650,160) 75(1750,60) 76(1750,160) 77(1850,60) 78(1850,160) 79(1950,60) 80(1950,160)
Top Overlay:
  lines w8: -2005.08,-330.55 2005.08,-330.55 2005.08,-4.17 -2005.08,-4.17 -2005.08,-330.55
  text "1" at -1973.43,-301.18 h56.1
  text "2" at -1976.38,-86.61 h56.1
Mechanical 16:
  rectangle: -1960,0 -1940,170
  rectangle: -1860,0 -1840,170
  rectangle: -1760,0 -1740,170
  rectangle: -1660,0 -1640,170
  rectangle: -1560,0 -1540,170
  rectangle: -1460,0 -1440,170
  rectangle: -1360,0 -1340,170
  rectangle: -1260,0 -1240,170
  rectangle: -1160,0 -1140,170
  rectangle: -1060,0 -1040,170
  rectangle: -960,0 -940,170
  rectangle: -860,0 -840,170
  rectangle: -760,0 -740,170
  rectangle: -660,0 -640,170
  rectangle: -560,0 -540,170
  rectangle: -460,0 -440,170
  rectangle: -360,0 -340,170
  rectangle: -260,0 -240,170
  rectangle: -160,0 -140,170
  rectangle: -60,0 -40,170
  rectangle: 40,0 60,170
  rectangle: 140,0 160,170
  rectangle: 240,0 260,170
  rectangle: 340,0 360,170
  rectangle: 440,0 460,170
  rectangle: 540,0 560,170
  rectangle: 640,0 660,170
  rectangle: 740,0 760,170
  rectangle: 840,0 860,170
  rectangle: 940,0 960,170
  rectangle: 1040,0 1060,170
  rectangle: 1140,0 1160,170
  rectangle: 1240,0 1260,170
  rectangle: 1340,0 1360,170
  rectangle: 1440,0 1460,170
  rectangle: 1540,0 1560,170
  rectangle: 1640,0 1660,170
  rectangle: 1740,0 1760,170
  rectangle: 1840,0 1860,170
  rectangle: 1940,0 1960,170

## SSW-140-02-S-Q [mm]
pads (80):
  oct 1.5x1.5 hole 1: 1(-49.53,-2.54) 2(-49.53,2.54) 3(-46.99,-2.54) 4(-46.99,2.54) 5(-44.45,-2.54) 6(-44.45,2.54) 7(-41.91,-2.54) 8(-41.91,2.54) 9(-39.37,-2.54) 10(-39.37,2.54) 11(-36.83,-2.54) 12(-36.83,2.54) 13(-34.29,-2.54) 14(-34.29,2.54) 15(-31.75,-2.54) 16(-31.75,2.54) 17(-29.21,-2.54) 18(-29.21,2.54) 19(-26.67,-2.54) 20(-26.67,2.54) 21(-24.13,-2.54) 22(-24.13,2.54) 23(-21.59,-2.54) 24(-21.59,2.54) 25(-19.05,-2.54) 26(-19.05,2.54) 27(-16.51,-2.54) 28(-16.51,2.54) 29(-13.97,-2.54) 30(-13.97,2.54) 31(-11.43,-2.54) 32(-11.43,2.54) 33(-8.89,-2.54) 34(-8.89,2.54) 35(-6.35,-2.54) 36(-6.35,2.54) 37(-3.81,-2.54) 38(-3.81,2.54) 39(-1.27,-2.54) 40(-1.27,2.54) 41(1.27,-2.54) 42(1.27,2.54) 43(3.81,-2.54) 44(3.81,2.54) 45(6.35,-2.54) 46(6.35,2.54) 47(8.89,-2.54) 48(8.89,2.54) 49(11.43,-2.54) 50(11.43,2.54) 51(13.97,-2.54) 52(13.97,2.54) 53(16.51,-2.54) 54(16.51,2.54) 55(19.05,-2.54) 56(19.05,2.54) 57(21.59,-2.54) 58(21.59,2.54) 59(24.13,-2.54) 60(24.13,2.54) 61(26.67,-2.54) 62(26.67,2.54) 63(29.21,-2.54) 64(29.21,2.54) 65(31.75,-2.54) 66(31.75,2.54) 67(34.29,-2.54) 68(34.29,2.54) 69(36.83,-2.54) 70(36.83,2.54) 71(39.37,-2.54) 72(39.37,2.54) 73(41.91,-2.54) 74(41.91,2.54) 75(44.45,-2.54) 76(44.45,2.54) 77(46.99,-2.54) 78(46.99,2.54) 79(49.53,-2.54) 80(49.53,2.54)
Top Overlay:
  lines w0.203: -50.929,-3.695 50.929,-3.695 50.929,3.695 -50.929,3.695 -50.929,-3.695
  text "1" at -50.038,-5.588 h1.42
  text "2" at -50.038,4.064 h1.42
Mechanical 16:
  drawing of 320 lines, arcs and shapes, not listed